# Altium schematic symbol library IC_ADI.SCHLIB: 3169 symbols (part 129 of 181)
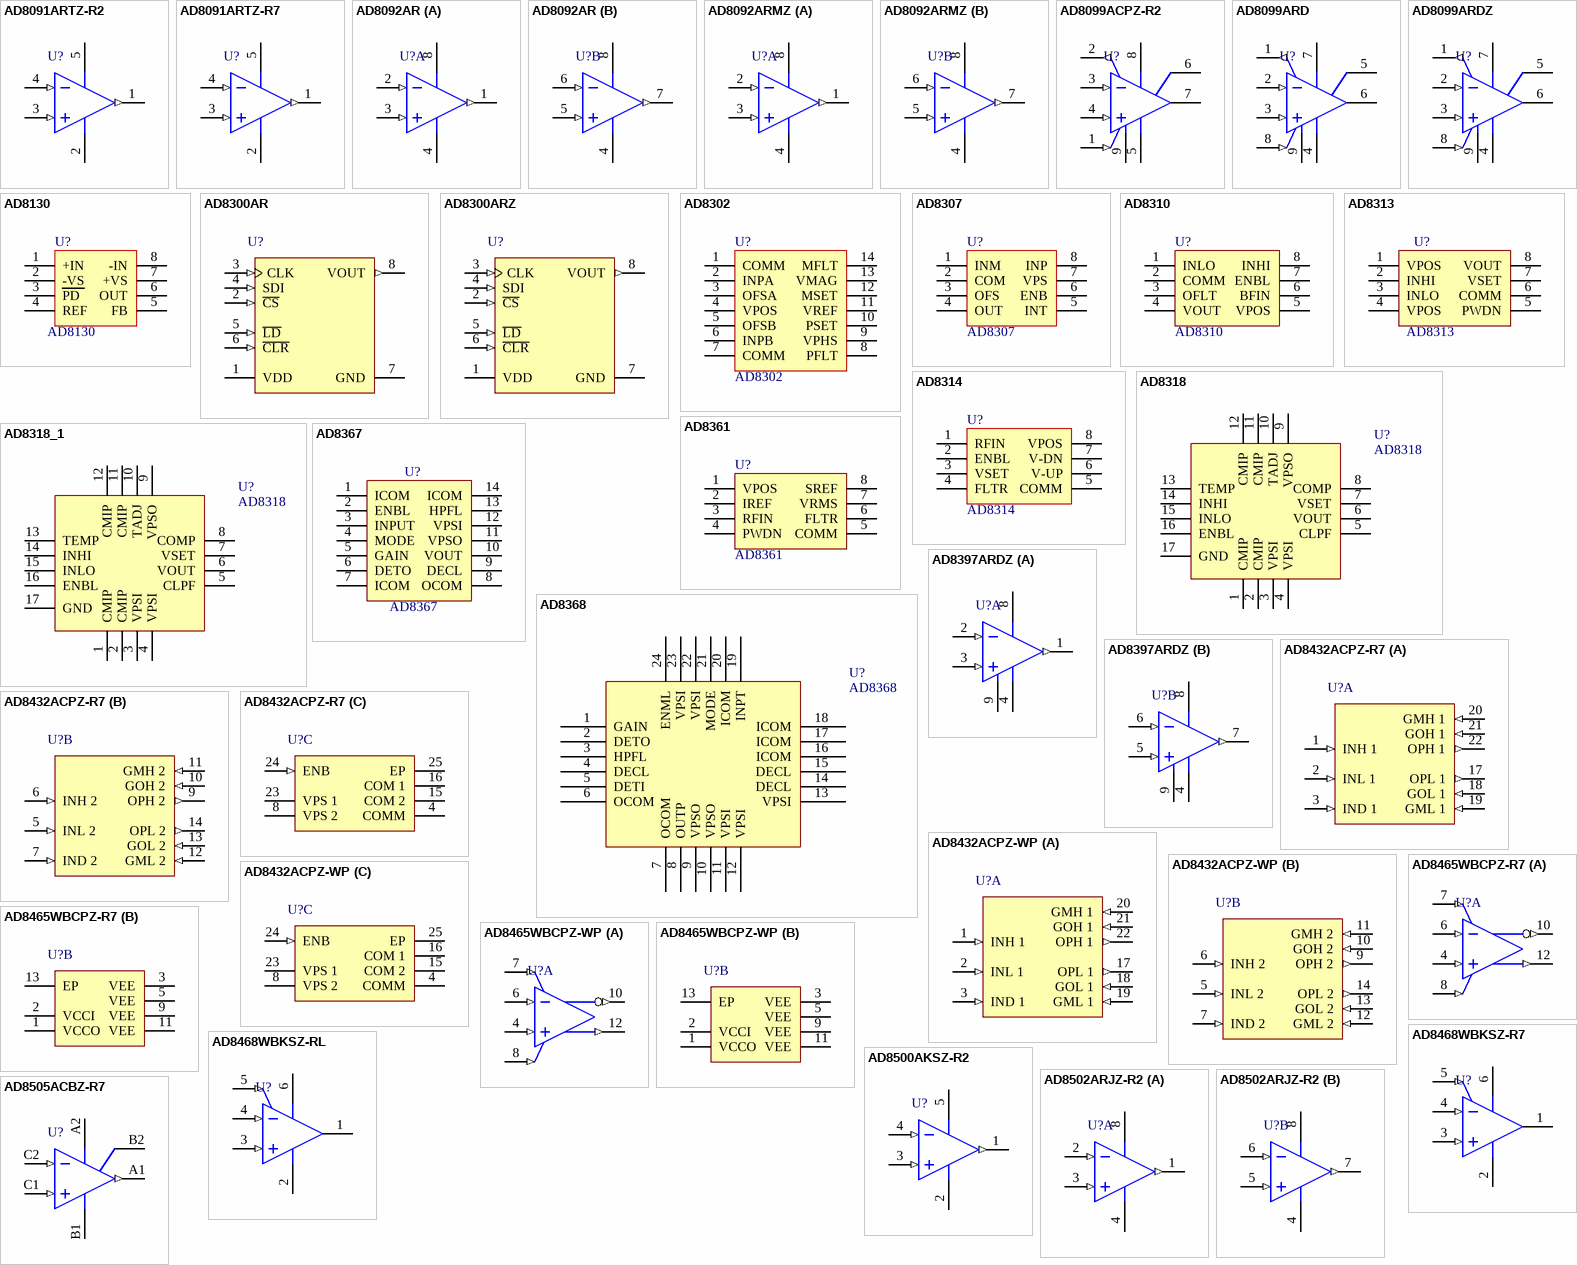
[diagram p319: symbols AD8091ARTZ-R2 to AD8505ACBZ-R7]

## AD8099ACPZ-R2
designator U?
Single Channel Ultra Low Noise Operational Amplifier, 500 MHz BW, 1.35 KV/us SR, Industrial, 8-pin QFN (CP-8-2), Reel; Generic Part Number: AD8099; PartNumber: AD8099ACPZ-R2; Amplifiers Per Package: 1; Input Bias Current: 3uA; Input Offset Voltage: 100uV; Iq/Amp: 16mA; Small Signal Bandwidth: 500MHz; V Span Max: 12V; V Span Min: 5V; DatasheetVersion: Rev. B; PackageVersion: 061507-B; PackageReference: CP-8-2; PackageDescription: 8-Pin Lead Frame Chip Scale Package, Body 3 x 3 mm, Pitch 0.5 mm; Supplier Part Number 1: 59K6359; Slew Rate: 1.35KV/us; Mounting Technology: Surface Mount; ComponentLink1Description: Manufacturer URL; ComponentLink2Description: Datasheet; ComponentLink3Description: Package Specification
footprint DFN8_0.5-PAD(3X3) (Footprint not found)
pins: 1 ~{DISABLE} (in), 2 FEEDBACK (out), 3 -IN (in), 4 +IN (in), 5 -VS (power), 6 CC, 7 VOUT (hiz), 8 +VS (power), 9 EP

## AD8099ARD
designator U?
Single Channel Ultra Low Noise Operational Amplifier, 500 MHz BW, 1.35 KV/us SR, Industrial, 8-pin SOIC (RD-8-1), Tube; Generic Part Number: AD8099; PartNumber: AD8099ARD; Amplifiers Per Package: 1; Input Bias Current: 3uA; Input Offset Voltage: 100uV; Iq/Amp: 16mA; Small Signal Bandwidth: 500MHz; V Span Max: 12V; V Span Min: 5V; DatasheetVersion: Rev. B; PackageVersion: 060506-A; PackageReference: RD-8-1; PackageDescription: 8-Pin Standard Small Outline Package, Body 4.9 x 3.9 mm, Pitch 1.27 mm; Supplier Part Number 1: AD8099ARD-ND; Slew Rate: 1.35KV/us; Mounting Technology: Surface Mount; Code_JEDEC: MS-012-AA; ComponentLink1Description: Manufacturer URL; ComponentLink2Description: Datasheet; ComponentLink3Description: Package Specification
footprint SOIC8_1.27-PAD (Footprint not found)
pins: 1 FEEDBACK (out), 2 -IN (in), 3 +IN (in), 4 -VS (power), 5 CC, 6 VOUT (hiz), 7 +VS (power), 8 ~{DISABLE} (in), 9 EP

## AD8099ARDZ
designator U?
Single Channel Ultra Low Noise Operational Amplifier, 500 MHz BW, 1.35 KV/us SR, Industrial, 8-pin SOIC (RD-8-1), Tube; Generic Part Number: AD8099; PartNumber: AD8099ARDZ; Amplifiers Per Package: 1; Input Bias Current: 3uA; Input Offset Voltage: 100uV; Iq/Amp: 16mA; Small Signal Bandwidth: 500MHz; V Span Max: 12V; V Span Min: 5V; DatasheetVersion: Rev. B; PackageVersion: 060506-A; PackageReference: RD-8-1; PackageDescription: 8-Pin Standard Small Outline Package, Body 4.9 x 3.9 mm, Pitch 1.27 mm; Supplier Part Number 1: AD8099ARDZ-ND; Supplier Part Number 2: 8397848; Supplier Part Number 3: 19M0932; Slew Rate: 1.35KV/us; Mounting Technology: Surface Mount; Code_JEDEC: MS-012-AA; ComponentLink1Description: Manufacturer URL; ComponentLink2Description: Datasheet; ComponentLink3Description: Package Specification
footprint SOIC8_1.27-PAD (Footprint not found)
pins: 1 FEEDBACK (out), 2 -IN (in), 3 +IN (in), 4 -VS (power), 5 CC, 6 VOUT (hiz), 7 +VS (power), 8 ~{DISABLE} (in), 9 EP

## AD8130
designator U?
footprint SOIC8_1.27 (SOP, 8-Leads, Pitch 1.27mm)
pins: 1 +IN, 2 -VS, 3 PD, 4 REF, 5 FB, 6 OUT, 7 +VS, 8 -IN

## AD8300AR
designator U?
Single 12-Bit Digital-to-Analog Converter with Serial Interface, 3 V, -40 to +85 degC, R-8, Tube; Generic Part Number: AD8300; PartNumber: AD8300AR; # DAC Outputs: 1; Max V+: 5.5V; Op Pwr Diss: 8.5mW; Resolution (Bits): 12; Settling Time: 14祍; Single Supply: Yes; DatasheetVersion: Rev.A; PackageVersion: 060506-A; PackageReference: R-8; PackageDescription: 8-Lead Standard Small Outline Package [SOIC_N] Narrow Body; Supplier Part Number 1: AD8300AR-ND; Supplier Part Number 2: 584-AD8300AR; Packing: Tube; RoHS: N; Mounting Technology: Surface Mount; Code_JEDEC: MS-012-AA; Code_IPC: SOIC127P600-8; ComponentLink1Description: Manufacturer URL; ComponentLink2Description: Datasheet; ComponentLink3Description: Package Specification; ComponentLink4Description: Product URL
footprint SOIC8_1.27 (Footprint not found)
pins: 1 VDD (power) "Positive power supply input. Specified range of operation +2.7 V to +5.5 V.", 2 ~{CS} (in) "Chip Select, active low input. Disables shift register loading when high. Does not affect L\D\ operation.", 3 CLK (in) "Clock input, positive edge clocks data into shift register.", 4 SDI (in) "Serial Data Input, input data loads directly into the shift register, MSB first.", 5 ~{LD} (in) "Load DAC register strobes, active low. Transfers shift register data to DAC register. See Truth Table I for operation. Asynchronous active low input.", 6 ~{CLR} (in) "Resets DAC register to zero condition. Asynchronous active low input.", 7 GND (power) "Analog and Digital Ground.", 8 VOUT (out) "DAC voltage output, 2.0475 V full scale with 0.5 mV per bit. An internal temperature stabilized reference maintains a fixed full-scale voltage independent of time, temperature and power supply variations."

## AD8300ARZ
designator U?
Single 12-Bit Digital-to-Analog Converter with Serial Interface, 3 V, -40 to +85 degC, R-8, Pb-Free, Tube; Generic Part Number: AD8300; PartNumber: AD8300ARZ; # DAC Outputs: 1; Max V+: 5.5V; Op Pwr Diss: 8.5mW; Resolution (Bits): 12; Settling Time: 14祍; Single Supply: Yes; DatasheetVersion: Rev.A; PackageVersion: 060506-A; PackageReference: R-8; PackageDescription: 8-Lead Standard Small Outline Package [SOIC_N] Narrow Body; Supplier Part Number 1: AD8300ARZ-ND; Supplier Part Number 2: 1438629; Supplier Part Number 3: 59K6546; Supplier Part Number 4: 584-AD8300ARZ; Packing: Tube; RoHS: Y; Mounting Technology: Surface Mount; Code_JEDEC: MS-012-AA; Code_IPC: SOIC127P600-8; ComponentLink1Description: Manufacturer URL; ComponentLink2Description: Datasheet; ComponentLink3Description: Package Specification; ComponentLink4Description: Product URL
footprint SOIC8_1.27 (Footprint not found)
pins: 1 VDD (power) "Positive power supply input. Specified range of operation +2.7 V to +5.5 V.", 2 ~{CS} (in) "Chip Select, active low input. Disables shift register loading when high. Does not affect L\D\ operation.", 3 CLK (in) "Clock input, positive edge clocks data into shift register.", 4 SDI (in) "Serial Data Input, input data loads directly into the shift register, MSB first.", 5 ~{LD} (in) "Load DAC register strobes, active low. Transfers shift register data to DAC register. See Truth Table I for operation. Asynchronous active low input.", 6 ~{CLR} (in) "Resets DAC register to zero condition. Asynchronous active low input.", 7 GND (power) "Analog and Digital Ground.", 8 VOUT (out) "DAC voltage output, 2.0475 V full scale with 0.5 mV per bit. An internal temperature stabilized reference maintains a fixed full-scale voltage independent of time, temperature and power supply variations."

## AD8302
designator U?
footprint TSSOP14_0.65 (TSOP, 14-Leads, Body 5.00x4.40mm, Pitch 0.65mm, Thermal Pad 2.31x2.46mm, IPC Low Density)
pins: 1 COMM, 2 INPA, 3 OFSA, 4 VPOS, 5 OFSB, 6 INPB, 7 COMM, 8 PFLT, 9 VPHS, 10 PSET, 11 VREF, 12 MSET, 13 VMAG, 14 MFLT

## AD8307
designator U?
footprint SOIC8_1.27 (SOP, 8-Leads, Pitch 1.27mm)
pins: 1 INM, 2 COM, 3 OFS, 4 OUT, 5 INT, 6 ENB, 7 VPS, 8 INP

## AD8310
designator U?
footprint VSSOP8_0.65
pins: 1 INLO, 2 COMM, 3 OFLT, 4 VOUT, 5 VPOS, 6 BFIN, 7 ENBL, 8 INHI

## AD8313
designator U?
footprint VSSOP8_0.65
pins: 1 VPOS, 2 INHI, 3 INLO, 4 VPOS, 5 PWDN, 6 COMM, 7 VSET, 8 VOUT

## AD8314
designator U?
footprint VSSOP8_0.65
pins: 1 RFIN, 2 ENBL, 3 VSET, 4 FLTR, 5 COMM, 6 V-UP, 7 V-DN, 8 VPOS

## AD8318
designator U?
footprint QFN16_0.65-PAD(4x4) (QFN, 16-Leads, Body 3.0x3.0mm (max), Pitch 0.50mm, IPC Low Density)
pins: 1 CMIP, 2 CMIP, 3 VPSI, 4 VPSI, 5 CLPF, 6 VOUT, 7 VSET, 8 COMP, 9 VPSO, 10 TADJ, 11 CMIP, 12 CMIP, 13 TEMP, 14 INHI, 15 INLO, 16 ENBL, 17 GND

## AD8318_1
designator U?, comment AD8318
pins: 1 CMIP, 2 CMIP, 3 VPSI, 4 VPSI, 5 CLPF, 6 VOUT, 7 VSET, 8 COMP, 9 VPSO, 10 TADJ, 11 CMIP, 12 CMIP, 13 TEMP, 14 INHI, 15 INLO, 16 ENBL, 17 GND

## AD8361
designator U?
footprint VSSOP8_0.65
pins: 1 VPOS, 2 IREF, 3 RFIN, 4 PWDN, 5 COMM, 6 FLTR, 7 VRMS, 8 SREF

## AD8367
designator U?
footprint TSSOP14_0.65 (TSOP, 14-Leads, Body 5.00x4.40mm, Pitch 0.65mm, Thermal Pad 2.31x2.46mm, IPC Low Density)
pins: 1 ICOM, 2 ENBL, 3 INPUT, 4 MODE, 5 GAIN, 6 DETO, 7 ICOM, 8 OCOM, 9 DECL, 10 VOUT, 11 VPSO, 12 VPSI, 13 HPFL, 14 ICOM

## AD8368
designator U?
footprint QFN24_0.5(4X4)
pins: 1 GAIN, 2 DETO, 3 HPFL, 4 DECL, 5 DETI, 6 OCOM, 7 OCOM, 8 OUTP, 9 VPSO, 10 VPSO, 11 VPSI, 12 VPSI, 13 VPSI, 14 DECL, 15 DECL, 16 ICOM, 17 ICOM, 18 ICOM, 19 INPT, 20 ICOM, 21 MODE, 22 VPSI, 23 VPSI, 24 ENML

## AD8397ARDZ
designator U?
Double Channel Low Noise Operational Amplifier, 69 MHz BW, 53 V/us SR, Industrial, 8-pin SOIC (RD-8-2), Tube; Generic Part Number: AD8397; PartNumber: AD8397ARDZ; Amplifiers Per Package: 2; Input Bias Current: 200nA; Input Offset Voltage: 1mV; Iq/Amp: 15mA; Slew Rate: 53V/us; Small Signal Bandwidth: 69MHz; V Span Max: 24V; V Span Min: 3V; DatasheetVersion: Rev. A; PackageReference: RD-8-2; PackageDescription: 8-Pin Standard Small Outline Package, Body 4.9 x 3.9 mm, Pitch 1.27 mm; Supplier Part Number 1: AD8397ARDZ-ND; Supplier Part Number 2: 1078283; Supplier Part Number 3: 59K6702; Mounting Technology: Surface Mount; Code_JEDEC: MS-012-AA; ComponentLink1Description: Manufacturer URL; ComponentLink2Description: Datasheet; ComponentLink3Description: Package Specification
footprint SOIC8_1.27-PAD (Footprint not found)
pins on every part: 4 -VS (power), 8 +VS (power), 9 EP
part A pins: 1 OUT 1 (out), 2 -IN 1 (in), 3 +IN 1 (in)
part B pins: 5 +IN 2 (in), 6 -IN 2 (in), 7 OUT 2 (out)

## AD8432ACPZ-R7
designator U?
Double Channel Low Power Operational Amplifier, 200 MHz BW, 170 V/us SR, Industrial, 24-pin QFN (CP-24-7), Reel; Generic Part Number: AD8432; PartNumber: AD8432ACPZ-R7; Amplifiers Per Package: 2; Input Offset Voltage: 1mV; Iq/Amp: 12mA; Small Signal Bandwidth: 200MHz; V Span Max: 5.5V; V Span Min: 4.5V; DatasheetVersion: Rev. C; PackageVersion: 112108-A; PackageReference: CP-24-7; PackageDescription: 24-Pin Lead Frame Chip Scale Package, Body 4 x 4 mm, Pitch 0.5 mm; Supplier Part Number 1: AD8432ACPZ-R7-ND; Supplier Part Number 2: 52R8167; Packing: Reel; Slew Rate: 170V/us; Mounting Technology: Surface Mount; Code_JEDEC: MO-220-WGGD; ComponentLink1Description: Manufacturer URL; ComponentLink2Description: Datasheet; ComponentLink3Description: Package Specification
footprint QFN24_0.5-PAD(4X4) (Footprint not found)
part A pins: 1 INH 1 (in) "LNA1 Noninverting Input.", 2 INL 1 (in) "LNA1 Inverting Input (AC-Coupled to Ground).", 3 IND 1 (in) "Integrated Input Clamping Back-to-Back Diodes.", 17 OPL 1 (out) "Inverting Output of LNA1.", 18 GOL 1 (in) "Gain Setting Pin for LNA1.", 19 GML 1 (in) "Gain Setting Pin for LNA1.", 20 GMH 1 (in) "Gain Setting Pin for LNA1.", 21 GOH 1 (in) "Gain Setting Pin for LNA1.", 22 OPH 1 (out) "Noninverting Output of LNA1."
part B pins: 5 INL 2 (in) "LNA2 Inverting Input (AC-Coupled to Ground).", 6 INH 2 (in) "LNA2 Noninverting Input.", 7 IND 2 (in) "Integrated Input Clamping Back-to-Back Diodes.", 9 OPH 2 (out) "Noninverting Output of LNA2.", 10 GOH 2 (in) "Gain Setting Pin for LNA2.", 11 GMH 2 (in) "Gain Setting Pin for LNA2.", 12 GML 2 (in) "Gain Setting Pin for LNA2.", 13 GOL 2 (in) "Gain Setting Pin for LNA2.", 14 OPL 2 (out) "Inverting Output of LNA2."
part C pins: 4 COMM (power) "Input Ground.", 8 VPS 2 (power) "5 V Supply.", 15 COM 2 (power) "LNA2 Output Ground.", 16 COM 1 (power) "LNA1 Output Ground.", 23 VPS 1 (power) "5 V Supply.", 24 ENB (in) "Enable.", 25 EP (power) "Exposed pad must be connected to ground."

## AD8432ACPZ-WP
designator U?
Double Channel Low Power Operational Amplifier, 200 MHz BW, 170 V/us SR, Industrial, 24-pin QFN (CP-24-7), Tray; Generic Part Number: AD8432; PartNumber: AD8432ACPZ-WP; Amplifiers Per Package: 2; Input Offset Voltage: 1mV; Iq/Amp: 12mA; Small Signal Bandwidth: 200MHz; V Span Max: 5.5V; V Span Min: 4.5V; DatasheetVersion: Rev. C; PackageVersion: 112108-A; PackageReference: CP-24-7; PackageDescription: 24-Pin Lead Frame Chip Scale Package, Body 4 x 4 mm, Pitch 0.5 mm; Supplier Part Number 1: AD8432ACPZ-WP-ND; Supplier Part Number 2: 1827462; Supplier Part Number 3: 52R8168; Packing: Tray; Slew Rate: 170V/us; Mounting Technology: Surface Mount; Code_JEDEC: MO-220-WGGD; ComponentLink1Description: Manufacturer URL; ComponentLink2Description: Datasheet; ComponentLink3Description: Package Specification
footprint QFN24_0.5-PAD(4X4) (Footprint not found)
part A pins: 1 INH 1 (in) "LNA1 Noninverting Input.", 2 INL 1 (in) "LNA1 Inverting Input (AC-Coupled to Ground).", 3 IND 1 (in) "Integrated Input Clamping Back-to-Back Diodes.", 17 OPL 1 (out) "Inverting Output of LNA1.", 18 GOL 1 (in) "Gain Setting Pin for LNA1.", 19 GML 1 (in) "Gain Setting Pin for LNA1.", 20 GMH 1 (in) "Gain Setting Pin for LNA1.", 21 GOH 1 (in) "Gain Setting Pin for LNA1.", 22 OPH 1 (out) "Noninverting Output of LNA1."
part B pins: 5 INL 2 (in) "LNA2 Inverting Input (AC-Coupled to Ground).", 6 INH 2 (in) "LNA2 Noninverting Input.", 7 IND 2 (in) "Integrated Input Clamping Back-to-Back Diodes.", 9 OPH 2 (out) "Noninverting Output of LNA2.", 10 GOH 2 (in) "Gain Setting Pin for LNA2.", 11 GMH 2 (in) "Gain Setting Pin for LNA2.", 12 GML 2 (in) "Gain Setting Pin for LNA2.", 13 GOL 2 (in) "Gain Setting Pin for LNA2.", 14 OPL 2 (out) "Inverting Output of LNA2."
part C pins: 4 COMM (power) "Input Ground.", 8 VPS 2 (power) "5 V Supply.", 15 COM 2 (power) "LNA2 Output Ground.", 16 COM 1 (power) "LNA1 Output Ground.", 23 VPS 1 (power) "5 V Supply.", 24 ENB (in) "Enable.", 25 EP (power) "Exposed pad must be connected to ground."

## AD8465WBCPZ-R7
designator U?
Rail-to-Rail, Very Fast, Single-Supply LVDS Comparator, 2.5 to 5.5 V, 1.6 ns Delay, Automotive, 12-pin QFN (CP-12-3), Reel; PartNumber: AD8465WBCPZ-R7; Input Range (V): -0.2 to VCCI+0.2; Total Power (mW): 42mW; DatasheetVersion: Rev. A; PackageVersion: 032707-A, 03/2007; PackageReference: CP-12-3; PackageDescription: 12-Pin Lead Frame Chip Scale Package, Body 3 x 3 mm, Pitch 0.5 mm; Supplier Part Number 1: AD8465WBCPZ-R7TR-ND; Supplier Part Number 2: AD8465WBCPZ-R7CT-ND; Supplier Part Number 3: AD8465WBCPZ-R7DKR-ND; Supplier Part Number 4: 584-AD8465WBCPZ-R7; Packing: Reel; Voltage Supply (V): 2.5 to 5.5; Mounting Technology: Surface Mount; Code_JEDEC: MO-220-VEED-1; ComponentLink1Description: Manufacturer URL; ComponentLink2Description: Datasheet; ComponentLink3Description: Package Specification; ComponentLink4Description: URL Link1
footprint QFN12_0.5-PAD(3X3) (Footprint not found)
part A pins: 4 VP (in) "Noninverting Analog Input.", 6 VN (in) "Inverting Analog Input.", 7 SDN (in) "Shutdown. Drive this pin low to shut down the device.", 8 LE/HYS (in) "Latch/Hysteresis Control. Bias with resistor or current for hysteresis; drive low to latch.", 10 ~{Q} (out) "Inverting Output. Q\ is at Logic low if the analog voltage at the noninverting input, VP, is greater than the analog voltage at the inverting input, VN, if the comparator is in compare mode.", 12 Q (out) "Noninverting Output. Q is at Logic high if the analog voltage at the noninverting input, VP, is greater than the analog voltage at the inverting input, VN, if the comparator is in compare mode."
part B pins: 1 VCCO (power) "Output Section Supply.", 2 VCCI (power) "Input Section Supply.", 3 VEE (power) "Negative Supply Voltages.", 5 VEE (power) "Negative Supply Voltages.", 9 VEE (power) "Negative Supply Voltages.", 11 VEE (power) "Negative Supply Voltages.", 13 EP "The metallic back surface of the package is electrically connected to VEE. It can be left floating because Pin 3, Pin 5, Pin 9, and Pin 11 provide adequate electrical connection. It can also be soldered to the application (See Datasheet)"

## AD8465WBCPZ-WP
designator U?
Rail-to-Rail, Very Fast, Single-Supply LVDS Comparator, 2.5 to 5.5 V, 1.6 ns Delay, Automotive, 12-pin QFN (CP-12-3), Tray; PartNumber: AD8465WBCPZ-WP; Input Range (V): -0.2 to VCCI+0.2; Total Power (mW): 42mW; DatasheetVersion: Rev. A; PackageVersion: 032707-A, 03/2007; PackageReference: CP-12-3; PackageDescription: 12-Pin Lead Frame Chip Scale Package, Body 3 x 3 mm, Pitch 0.5 mm; Supplier Part Number 1: AD8465WBCPZ-WP-ND; Supplier Part Number 2: 1827369; Supplier Part Number 3: 584-AD8465WBCPZ-WP; Packing: Tray; Voltage Supply (V): 2.5 to 5.5; Mounting Technology: Surface Mount; Code_JEDEC: MO-220-VEED-1; ComponentLink1Description: Manufacturer URL; ComponentLink2Description: Datasheet; ComponentLink3Description: Package Specification; ComponentLink4Description: URL Link1
footprint QFN12_0.5-PAD(3X3) (Footprint not found)
part A pins: 4 VP (in) "Noninverting Analog Input.", 6 VN (in) "Inverting Analog Input.", 7 SDN (in) "Shutdown. Drive this pin low to shut down the device.", 8 LE/HYS (in) "Latch/Hysteresis Control. Bias with resistor or current for hysteresis; drive low to latch.", 10 ~{Q} (out) "Inverting Output. Q\ is at Logic low if the analog voltage at the noninverting input, VP, is greater than the analog voltage at the inverting input, VN, if the comparator is in compare mode.", 12 Q (out) "Noninverting Output. Q is at Logic high if the analog voltage at the noninverting input, VP, is greater than the analog voltage at the inverting input, VN, if the comparator is in compare mode."
part B pins: 1 VCCO (power) "Output Section Supply.", 2 VCCI (power) "Input Section Supply.", 3 VEE (power) "Negative Supply Voltages.", 5 VEE (power) "Negative Supply Voltages.", 9 VEE (power) "Negative Supply Voltages.", 11 VEE (power) "Negative Supply Voltages.", 13 EP "The metallic back surface of the package is electrically connected to VEE. It can be left floating because Pin 3, Pin 5, Pin 9, and Pin 11 provide adequate electrical connection. It can also be soldered to the application (See Datasheet)"

## AD8468WBKSZ-R7
designator U?
Rail-to-Rail, Fast, Low Power, Single-Supply TTL / CMOS Comparator, 2.5 to 5.5 V, 40 ns Delay, Automotive, 6-pin SOT23 (KS-6), Reel; PartNumber: AD8468WBKSZ-R7; Input Range (V): -0.2 to VCC+0.2; Total Power (mW): 2mW; DatasheetVersion: Rev. 0; PackageVersion: 072809-A, 07/2009; PackageReference: KS-6; PackageDescription: 6-Pin Thin Shrink Small Outline Transistor Package, Body 2 x 1.25 mm, Pitch 0.65 mm; Supplier Part Number 1: AD8468WBKSZ-R7TR-ND; Supplier Part Number 2: AD8468WBKSZ-R7CT-ND; Supplier Part Number 3: AD8468WBKSZ-R7DKR-ND; Supplier Part Number 4: 2376806; Supplier Part Number 5: 1872638; Supplier Part Number 6: 584-AD8468WBKSZ-R7; Packing: Reel; Voltage Supply (V): 2.5 to 5.5; Mounting Technology: Surface Mount; Code_JEDEC: MO-203-AB; ComponentLink1Description: Manufacturer URL; ComponentLink2Description: Datasheet; ComponentLink3Description: Package Specification; ComponentLink4Description: URL Link1
footprint SOT363 (Footprint not found)
pins: 1 Q (hiz) "Noninverting Output. Q is at logic high if the analog voltage at the noninverting input, VP, is greater than the analog voltage at the inverting input, VN.", 2 GND (power) "Ground.", 3 VP (in) "Noninverting Analog Input.", 4 VN (in) "Inverting Analog Input.", 5 SDN (in) "Shutdown. Drive this pin low to shut down the device.", 6 VCC (power) "VCC Supply."

## AD8468WBKSZ-RL
designator U?
Rail-to-Rail, Fast, Low Power, Single-Supply TTL / CMOS Comparator, 2.5 to 5.5 V, 40 ns Delay, Automotive, 6-pin SOT23 (KS-6), Reel; PartNumber: AD8468WBKSZ-RL; Input Range (V): -0.2 to VCC+0.2; Total Power (mW): 2mW; DatasheetVersion: Rev. 0; PackageVersion: 072809-A, 07/2009; PackageReference: KS-6; PackageDescription: 6-Pin Thin Shrink Small Outline Transistor Package, Body 2 x 1.25 mm, Pitch 0.65 mm; Supplier Part Number 1: 584-AD8468WBKSZ-R; Packing: Reel; Voltage Supply (V): 2.5 to 5.5; Mounting Technology: Surface Mount; Code_JEDEC: MO-203-AB; ComponentLink1Description: Manufacturer URL; ComponentLink2Description: Datasheet; ComponentLink3Description: Package Specification; ComponentLink4Description: URL Link1
footprint SOT363 (Footprint not found)
pins: 1 Q (hiz) "Noninverting Output. Q is at logic high if the analog voltage at the noninverting input, VP, is greater than the analog voltage at the inverting input, VN.", 2 GND (power) "Ground.", 3 VP (in) "Noninverting Analog Input.", 4 VN (in) "Inverting Analog Input.", 5 SDN (in) "Shutdown. Drive this pin low to shut down the device.", 6 VCC (power) "VCC Supply."

## AD8500AKSZ-R2
designator U?
Single Channel RRIO Operational Amplifier, 7 KHz BW, 4 mV/us SR, Industrial, 5-pin SOT23 (KS-5), Reel; Generic Part Number: AD8500; PartNumber: AD8500AKSZ-R2; Amplifiers Per Package: 1; Input Bias Current: 1pA; Input Offset Voltage: 235uV; Iq/Amp: 750nA; Slew Rate: 4mV/us; Small Signal Bandwidth: 7KHz; V Span Max: 5.5V; V Span Min: 1.8V; DatasheetVersion: Rev. B; PackageVersion: 072809-A; PackageReference: KS-5; PackageDescription: 5-Pin Thin Shrink Small Outline Transistor Package, Body 2 x 1.25 mm, Pitch 0.65 mm; Supplier Part Number 1: AD8500AKSZ-R2-ND; Supplier Part Number 2: 1838864; Supplier Part Number 3: 12M9104; Mounting Technology: Surface Mount; Code_JEDEC: MO-203-AA; ComponentLink1Description: Manufacturer URL; ComponentLink2Description: Datasheet; ComponentLink3Description: Package Specification
footprint SOT353 (Footprint not found)
pins: 1 OUT A (out), 2 -V (power), 3 +IN (in), 4 -IN (in), 5 +V (power)

## AD8502ARJZ-R2
designator U?
Double Channel RRIO Operational Amplifier, 7 KHz BW, 4 mV/us SR, Industrial, 8-pin SOT23 (RJ-8), Reel; Generic Part Number: AD8502; PartNumber: AD8502ARJZ-R2; Amplifiers Per Package: 2; Input Bias Current: 1pA; Input Offset Voltage: 500uV; Iq/Amp: 1uA; Slew Rate: 4mV/us; Small Signal Bandwidth: 7KHz; V Span Max: 5.5V; V Span Min: 1.8V; DatasheetVersion: Rev. A; PackageVersion: 121608-A; PackageReference: RJ-8; PackageDescription: 8-Pin Small Outline Transistor Package, Body 2.9 x 1.6 mm, Pitch 0.65 mm; Supplier Part Number 1: AD8502ARJZ-R2TR-ND; Supplier Part Number 2: AD8502ARJZ-R2CT-ND; Supplier Part Number 3: AD8502ARJZ-R2DKR-ND; Supplier Part Number 4: 1699561; Supplier Part Number 5: 34M5069; Mounting Technology: Surface Mount; Code_JEDEC: MO-178-BA; ComponentLink1Description: Manufacturer URL; ComponentLink2Description: Datasheet; ComponentLink3Description: Package Specification
footprint SOT23-8 (Footprint not found)
pins on every part: 4 -V (power), 8 +V (power)
part A pins: 1 OUT A (out), 2 -IN A (in), 3 +IN A (in)
part B pins: 5 +IN B (in), 6 -IN B (in), 7 OUT B (out)

## AD8505ACBZ-R7
designator U?
Single Channel Rail-to-Rail Operational Amplifier, 95 Hz BW, 13 mV/us SR, Industrial, 6-pin BGA (CB-6-7), Reel; Generic Part Number: AD8505; PartNumber: AD8505ACBZ-R7; Amplifiers Per Package: 1; Input Bias Current: 1pA; Input Offset Voltage: 500uV; Iq/Amp: 25.5uA; Small Signal Bandwidth: 95Hz; V Span Max: 5V; V Span Min: 1.8V; DatasheetVersion: Rev. E; PackageVersion: 081709-A; PackageReference: CB-6-7; PackageDescription: 6-Ball Wafer Level Chip Scale Package, Body 1.385 x 0.905 mm, Pitch 0.4 mm; Supplier Part Number 1: AD8505ACBZ-R7TR-ND; Supplier Part Number 2: AD8505ACBZ-R7CT-ND; Supplier Part Number 3: AD8505ACBZ-R7DKR-ND; Slew Rate: 13mV/us; Mounting Technology: Surface Mount; ComponentLink1Description: Manufacturer URL; ComponentLink2Description: Datasheet; ComponentLink3Description: Package Specification
footprint BGA6_0.4(1.4x1) (Footprint not found)
pins: A1 OUT (out), A2 +V (power), B1 -V (power), B2 NC, C1 +IN (in), C2 -IN (in)

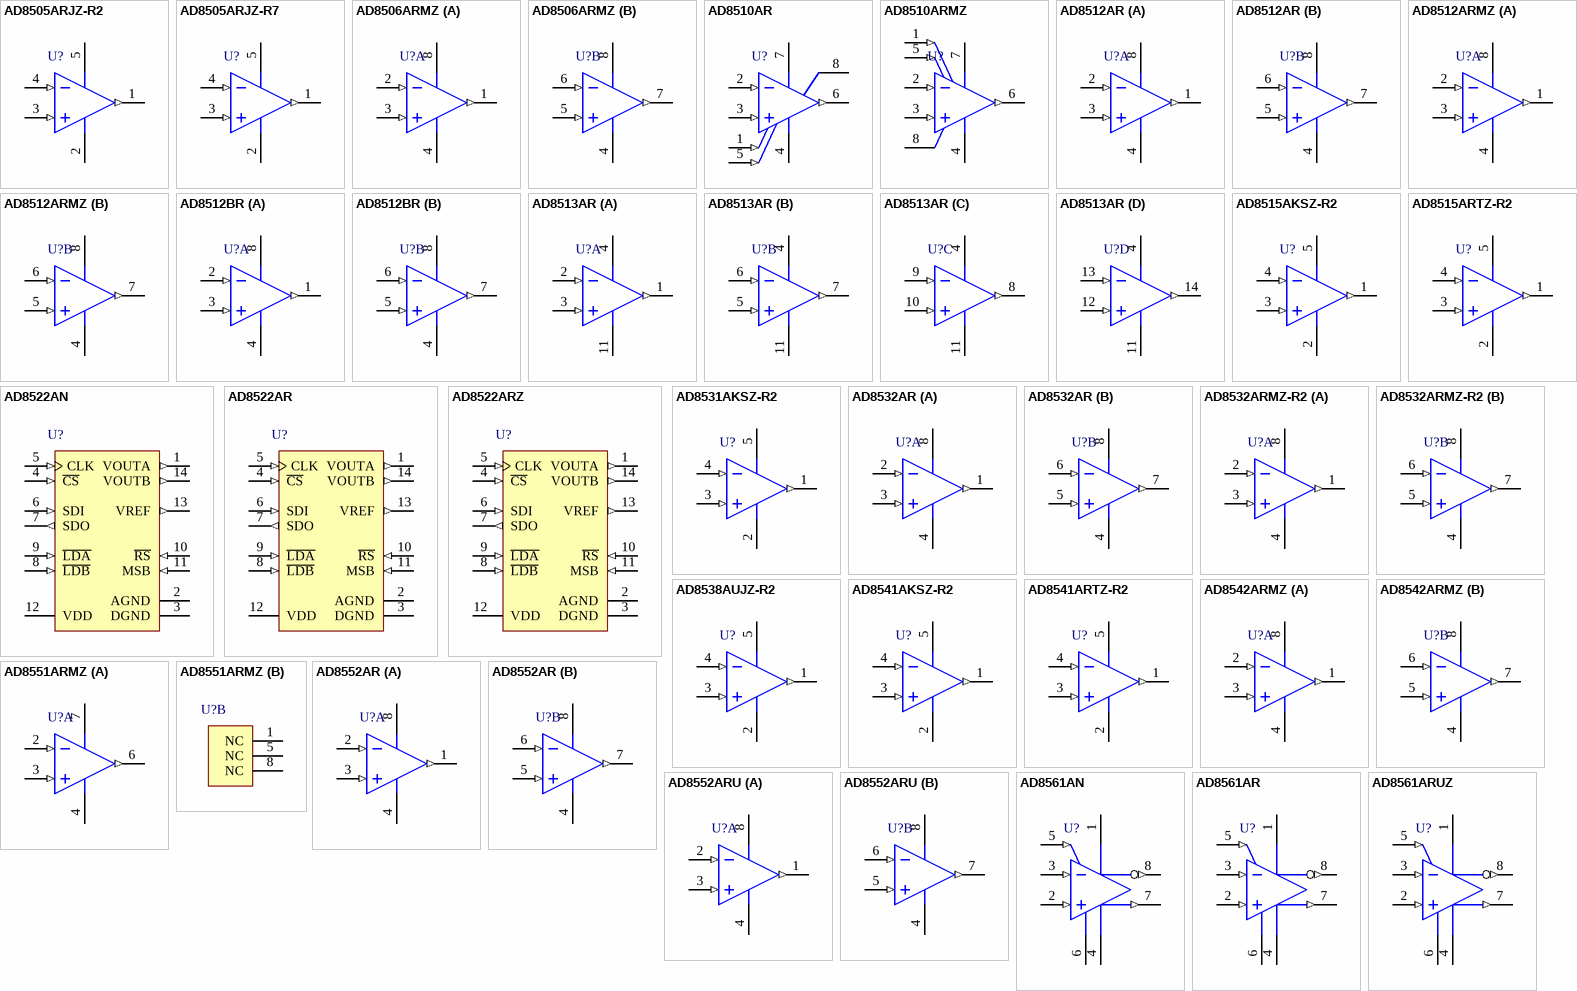
[diagram p95: symbols AD8505ARJZ-R2 to AD8561ARUZ]

## AD8505ARJZ-R2
designator U?
Single Channel Rail-to-Rail Operational Amplifier, 95 Hz BW, 13 mV/us SR, Industrial, 5-pin SOT23 (RJ-5), Reel; Generic Part Number: AD8505; PartNumber: AD8505ARJZ-R2; Amplifiers Per Package: 1; Input Bias Current: 1pA; Input Offset Voltage: 500uV; Iq/Amp: 25.5uA; Small Signal Bandwidth: 95Hz; V Span Max: 5V; V Span Min: 1.8V; DatasheetVersion: Rev. E; PackageVersion: 121608-A; PackageReference: RJ-5; PackageDescription: 5-Pin Small Outline Transistor Package, Body 2.9 x 1.6 mm, Pitch 0.95 mm; Supplier Part Number 1: AD8505ARJZ-R2TR-ND; Supplier Part Number 2: AD8505ARJZ-R2CT-ND; Supplier Part Number 3: AD8505ARJZ-R2DKR-ND; Slew Rate: 13mV/us; Mounting Technology: Surface Mount; Code_JEDEC: MO-178-AA; ComponentLink1Description: Manufacturer URL; ComponentLink2Description: Datasheet; ComponentLink3Description: Package Specification
footprint SOT23-5 (Footprint not found)
pins: 1 OUT (out), 2 -V (power), 3 +IN (in), 4 -IN (in), 5 +V (power)

## AD8505ARJZ-R7
designator U?
Single Channel Rail-to-Rail Operational Amplifier, 95 Hz BW, 13 mV/us SR, Industrial, 5-pin SOT23 (RJ-5), Reel; Generic Part Number: AD8505; PartNumber: AD8505ARJZ-R7; Amplifiers Per Package: 1; Input Bias Current: 1pA; Input Offset Voltage: 500uV; Iq/Amp: 25.5uA; Small Signal Bandwidth: 95Hz; V Span Max: 5V; V Span Min: 1.8V; DatasheetVersion: Rev. E; PackageVersion: 121608-A; PackageReference: RJ-5; PackageDescription: 5-Pin Small Outline Transistor Package, Body 2.9 x 1.6 mm, Pitch 0.95 mm; Supplier Part Number 1: AD8505ARJZ-R7-ND; Supplier Part Number 2: 1827370; Supplier Part Number 3: 1827370RL; Supplier Part Number 4: 85R5213; Supplier Part Number 5: 52R8171; Slew Rate: 13mV/us; Mounting Technology: Surface Mount; Code_JEDEC: MO-178-AA; ComponentLink1Description: Manufacturer URL; ComponentLink2Description: Datasheet; ComponentLink3Description: Package Specification
footprint SOT23-5 (Footprint not found)
pins: 1 OUT (out), 2 -V (power), 3 +IN (in), 4 -IN (in), 5 +V (power)

## AD8506ARMZ
designator U?
Double Channel Rail-to-Rail Operational Amplifier, 150 KHz BW, 13 mV/us SR, Industrial, 8-pin SOP (RM-8), Tube; Generic Part Number: AD8506; PartNumber: AD8506ARMZ; Amplifiers Per Package: 2; Input Bias Current: 1pA; Input Offset Voltage: 2.5mV; Iq/Amp: 20uA; Small Signal Bandwidth: 150KHz; V Span Max: 5.5V; V Span Min: 1.8V; DatasheetVersion: Rev. E; PackageReference: RM-8; PackageDescription: 8-Pin Mini Small Outline Package, Body 3 x 3 mm, Pitch 0.65 mm; Supplier Part Number 1: AD8506ARMZ-ND; Slew Rate: 13mV/us; Mounting Technology: Surface Mount; Code_JEDEC: MO-187-AA; ComponentLink1Description: Manufacturer URL; ComponentLink2Description: Datasheet; ComponentLink3Description: Package Specification
footprint VSSOP8_0.65 (Footprint not found)
pins on every part: 4 -V (power), 8 +V (power)
part A pins: 1 OUT A (out), 2 -IN A (in), 3 +IN A (in)
part B pins: 5 +IN B (in), 6 -IN B (in), 7 OUT B (out)

## AD8510AR
designator U?
Single Channel Low Offset Voltage Operational Amplifier, 8 MHz BW, 20 V/us SR, Industrial, 8-pin SOIC (R-8), Tube; Generic Part Number: AD8510; PartNumber: AD8510AR; Amplifiers Per Package: 1; Input Bias Current: 21pA; Input Offset Voltage: 80uV; Iq/Amp: 2.5mA; Slew Rate: 20V/us; Small Signal Bandwidth: 8MHz; V Span Max: 36V; V Span Min: 9V; DatasheetVersion: Rev. I; PackageVersion: 060506-A; PackageReference: R-8; PackageDescription: 8-Pin Standard Small Outline Package, Body 3.9 x 4.9 mm, Pitch 1.27 mm; Supplier Part Number 1: AD8510AR-ND; Mounting Technology: Surface Mount; Code_JEDEC: MS-012-AA; ComponentLink1Description: Manufacturer URL; ComponentLink2Description: Datasheet; ComponentLink3Description: Package Specification; ComponentLink4Description: Reference Circuit
footprint SOIC8_1.27 (Footprint not found)
pins: 1 NULL (in), 2 -IN (in), 3 +IN (in), 4 -V (power), 5 NULL (in), 6 OUT (out), 7 +V (power), 8 NC

## AD8510ARMZ
designator U?
Single Channel Low Offset Voltage Operational Amplifier, 8 MHz BW, 20 V/us SR, Industrial, 8-pin SOP (RM-8), Tube; Generic Part Number: AD8510; PartNumber: AD8510ARMZ; Amplifiers Per Package: 1; Input Bias Current: 21pA; Input Offset Voltage: 80uV; Iq/Amp: 2.5mA; Slew Rate: 20V/us; Small Signal Bandwidth: 8MHz; V Span Max: 36V; V Span Min: 9V; DatasheetVersion: Rev. I; PackageReference: RM-8; PackageDescription: 8-Pin Mini Small Outline Package, Body 3 x 3 mm, Pitch 0.65 mm; Supplier Part Number 1: AD8510ARMZ-ND; Supplier Part Number 2: 45P6465; Mounting Technology: Surface Mount; Code_JEDEC: MO-187-AA; ComponentLink1Description: Manufacturer URL; ComponentLink2Description: Datasheet; ComponentLink3Description: Package Specification; ComponentLink4Description: Reference Circuit
footprint VSSOP8_0.65 (Footprint not found)
pins: 1 NULL (in), 2 -IN (in), 3 +IN (in), 4 -V (power), 5 NULL (in), 6 OUT (out), 7 +V (power), 8 NC

## AD8512AR
designator U?
Double Channel Low Offset Voltage Operational Amplifier, 8 MHz BW, 20 V/us SR, Industrial, 8-pin SOIC (R-8), Tube; Generic Part Number: AD8512; PartNumber: AD8512AR; Amplifiers Per Package: 2; Input Bias Current: 21pA; Input Offset Voltage: 6pA; Iq/Amp: 2.5mA; Slew Rate: 20V/us; Small Signal Bandwidth: 8MHz; V Span Max: 36V; V Span Min: 9V; DatasheetVersion: Rev. I; PackageVersion: 060506-A; PackageReference: R-8; PackageDescription: 8-Pin Standard Small Outline Package, Body 3.9 x 4.9 mm, Pitch 1.27 mm; Supplier Part Number 1: AD8512AR-ND; Mounting Technology: Surface Mount; Code_JEDEC: MS-012-AA; ComponentLink1Description: Manufacturer URL; ComponentLink2Description: Datasheet; ComponentLink3Description: Package Specification; ComponentLink4Description: Reference Circuit
footprint SOIC8_1.27 (Footprint not found)
pins on every part: 4 -V (power), 8 +V (power)
part A pins: 1 OUT A (out), 2 -IN A (in), 3 +IN A (in)
part B pins: 5 +IN B (in), 6 -IN B (in), 7 OUT B (out)

## AD8512ARMZ
designator U?
Double Channel Low Offset Voltage Operational Amplifier, 8 MHz BW, 20 V/us SR, Industrial, 8-pin SOP (RM-8), Tube; Generic Part Number: AD8512; PartNumber: AD8512ARMZ; Amplifiers Per Package: 2; Input Bias Current: 21pA; Input Offset Voltage: 6pA; Iq/Amp: 2.5mA; Slew Rate: 20V/us; Small Signal Bandwidth: 8MHz; V Span Max: 36V; V Span Min: 9V; DatasheetVersion: Rev. I; PackageReference: RM-8; PackageDescription: 8-Pin Mini Small Outline Package, Body 3 x 3 mm, Pitch 0.65 mm; Supplier Part Number 1: AD8512ARMZ-ND; Supplier Part Number 2: 2112575; Supplier Part Number 3: 19P8301; Mounting Technology: Surface Mount; Code_JEDEC: MO-187-AA; ComponentLink1Description: Manufacturer URL; ComponentLink2Description: Datasheet; ComponentLink3Description: Package Specification; ComponentLink4Description: Reference Circuit
footprint VSSOP8_0.65 (Footprint not found)
pins on every part: 4 -V (power), 8 +V (power)
part A pins: 1 OUT A (out), 2 -IN A (in), 3 +IN A (in)
part B pins: 5 +IN B (in), 6 -IN B (in), 7 OUT B (out)

## AD8512BR
designator U?
Double Channel Low Offset Voltage Operational Amplifier, 8 MHz BW, 20 V/us SR, Industrial, 8-pin SOIC (R-8), Tube; Generic Part Number: AD8512; PartNumber: AD8512BR; Amplifiers Per Package: 2; Input Bias Current: 21pA; Input Offset Voltage: 6pA; Iq/Amp: 2.5mA; Slew Rate: 20V/us; Small Signal Bandwidth: 8MHz; V Span Max: 36V; V Span Min: 9V; DatasheetVersion: Rev. I; PackageVersion: 060506-A; PackageReference: R-8; PackageDescription: 8-Pin Standard Small Outline Package, Body 3.9 x 4.9 mm, Pitch 1.27 mm; Supplier Part Number 1: AD8512BR-ND; Mounting Technology: Surface Mount; Code_JEDEC: MS-012-AA; ComponentLink1Description: Manufacturer URL; ComponentLink2Description: Datasheet; ComponentLink3Description: Package Specification; ComponentLink4Description: Reference Circuit
footprint SOIC8_1.27 (Footprint not found)
pins on every part: 4 -V (power), 8 +V (power)
part A pins: 1 OUT A (out), 2 -IN A (in), 3 +IN A (in)
part B pins: 5 +IN B (in), 6 -IN B (in), 7 OUT B (out)

## AD8513AR
designator U?
Quad Channel Low Offset Voltage Operational Amplifier, 8 MHz BW, 20 V/us SR, Industrial, 14-pin SOIC (R-14), Tube; Generic Part Number: AD8513; PartNumber: AD8513AR; Amplifiers Per Package: 4; Input Bias Current: 25pA; Input Offset Voltage: 80uV; Iq/Amp: 2.5mA; Slew Rate: 20V/us; Small Signal Bandwidth: 8MHz; V Span Max: 36V; V Span Min: 9V; DatasheetVersion: Rev. I; PackageVersion: 060606-A; PackageReference: R-14; PackageDescription: 14-Pin Standard Small Outline Package, Body 8.65 x 3.9 mm, Pitch 1.27 mm; Supplier Part Number 1: AD8513AR-ND; Mounting Technology: Surface Mount; Code_JEDEC: MS-012-AB; ComponentLink1Description: Manufacturer URL; ComponentLink2Description: Datasheet; ComponentLink3Description: Package Specification
footprint SOIC14_1.27 (Footprint not found)
pins on every part: 4 +V (power), 11 -V (power)
part A pins: 1 OUT A (out), 2 -IN A (in), 3 +IN A (in)
part B pins: 5 +IN B (in), 6 -IN B (in), 7 OUT B (out)
part C pins: 8 OUT C (out), 9 -IN C (in), 10 +IN C (in)
part D pins: 12 +IN D (in), 13 -IN D (in), 14 OUT D (out)

## AD8515AKSZ-R2
designator U?
Single Channel RRIO Operational Amplifier, 5 MHz BW, 2.7 V/us SR, Industrial, 5-pin SOT23 (KS-5), Reel; Generic Part Number: AD8515; PartNumber: AD8515AKSZ-R2; Amplifiers Per Package: 1; Input Bias Current: 2pA; Input Offset Voltage: 1mV; Iq/Amp: 500uA; Small Signal Bandwidth: 5MHz; V Span Max: 6V; V Span Min: 1.8V; DatasheetVersion: Rev. D; PackageVersion: 072809-A; PackageReference: KS-5; PackageDescription: 5-Pin Thin Shrink Small Outline Transistor Package, Body 2 x 1.25 mm, Pitch 0.65 mm; Supplier Part Number 1: AD8515AKSZ-R2TR-ND; Supplier Part Number 2: AD8515AKSZ-R2CT-ND; Supplier Part Number 3: AD8515AKSZ-R2DKR-ND; Supplier Part Number 4: 2074883; Supplier Part Number 5: 59K6787; Slew Rate: 2.7V/us; Mounting Technology: Surface Mount; Code_JEDEC: MO-203-AA; ComponentLink1Description: Manufacturer URL; ComponentLink2Description: Datasheet; ComponentLink3Description: Package Specification; ComponentLink4Description: Reference Circuit
footprint SOT353 (Footprint not found)
pins: 1 OUT (out), 2 -V (power), 3 +IN (in), 4 -IN (in), 5 +V (power)

## AD8515ARTZ-R2
designator U?
Single Channel RRIO Operational Amplifier, 5 MHz BW, 2.7 V/us SR, Industrial, 5-pin SOT23 (RJ-5), Reel; Generic Part Number: AD8515; PartNumber: AD8515ARTZ-R2; Amplifiers Per Package: 1; Input Bias Current: 2pA; Input Offset Voltage: 1mV; Iq/Amp: 500uA; Small Signal Bandwidth: 5MHz; V Span Max: 6V; V Span Min: 1.8V; DatasheetVersion: Rev. D; PackageVersion: 121608-A; PackageReference: RJ-5; PackageDescription: 5-Pin Small Outline Transistor Package, Body 2.9 x 1.6 mm, Pitch 0.95 mm; Supplier Part Number 1: AD8515ARTZ-R2TR-ND; Supplier Part Number 2: AD8515ARTZ-R2CT-ND; Supplier Part Number 3: AD8515ARTZ-R2DKR-ND; Supplier Part Number 4: 1319454; Supplier Part Number 5: 19M8910; Slew Rate: 2.7V/us; Mounting Technology: Surface Mount; Code_JEDEC: MO-178-AA; ComponentLink1Description: Manufacturer URL; ComponentLink2Description: Datasheet; ComponentLink3Description: Package Specification; ComponentLink4Description: Reference Circuit
footprint SOT23-5 (Footprint not found)
pins: 1 OUT (out), 2 -V (power), 3 +IN (in), 4 -IN (in), 5 +V (power)

## AD8522AN
designator U?
Dual 12-Bit Digital-to-Analog Converter with Serial Interface, 5 V, -40 to +85 degC, N-14, Tube; Generic Part Number: AD8522; PartNumber: AD8522AN; # DAC Outputs: 2; Max V+: 5.5V; Op Pwr Diss: 25mW; Resolution (Bits): 12; Settling Time: 16祍; Single Supply: Yes; DatasheetVersion: Rev.A; PackageVersion: 070606-A; PackageReference: N-14; PackageDescription: 14-Lead Plastic Dual In-Line Package [PDIP] Narrow Body; Supplier Part Number 1: AD8522AN-ND; Supplier Part Number 2: 66F5918; Supplier Part Number 3: 584-AD8522AN; Packing: Tube; RoHS: N; Mounting Technology: Through Hole; Code_JEDEC: MS-001; ComponentLink1Description: Manufacturer URL; ComponentLink2Description: Datasheet; ComponentLink3Description: Package Specification; ComponentLink4Description: Product URL
footprint DIP14 (Footprint not found)
pins: 1 VOUTA (out) "DAC A voltage outputs, 4.095 V full scale, +/-5 mA output.", 2 AGND (power) "Analog Ground Input.", 3 DGND (power) "Digital Ground Input.", 4 ~{CS} (in) "Chip Select, active low input. Prevents shift register loading when high. Does not affect L\D\A\ and L\D\B\ operation.", 5 CLK (in) "Clock input, positive edge clocks data into shift register.", 6 SDI (in) "Serial Data Input, input data loads directly into the shift register.", 7 SDO (out) "Serial Data Output. Output of shift register, always active.", 8 ~{LDB} (in) "Load DAC register strobes, active low. Transfers shift register data to DAC register. See truth table for operation.Software decode feature only requires one L\D\ strobe. Tie L\D\A\ and L\D\B\ together or use one of them (See Datasheet)", 9 ~{LDA} (in) "Load DAC register strobes, active low. Transfers shift register data to DAC register. See truth table for operation.Software decode feature only requires one L\D\ strobe. Tie L\D\A\ and L\D\B\ together or use one of them (See Datasheet)", 10 ~{RS} (in) "Resets DAC registers to condition determined by MSB pin. Active low input.", 11 MSB (in) "Digital input: High presets DAC registers to half scale (800H); Low clears all registers to zero (000H), when R\S\ is strobed to active low.", 12 VDD (power) "Positive +5 V power supply input. Tolerance +/-10%.", 13 VREF (out) "Reference Voltage Output, 2.5 V nominal.", 14 VOUTB (out) "DAC B voltage outputs, 4.095 V full scale, +/-5 mA output."

## AD8522AR
designator U?
Dual 12-Bit Digital-to-Analog Converter with Serial Interface, 5 V, -40 to +85 degC, R-14, Tube; Generic Part Number: AD8522; PartNumber: AD8522AR; # DAC Outputs: 2; Max V+: 5.5V; Op Pwr Diss: 25mW; Resolution (Bits): 12; Settling Time: 16祍; Single Supply: Yes; DatasheetVersion: Rev.A; PackageVersion: 060606-A; PackageReference: R-14; PackageDescription: 14-Lead Standard Small Outline Package [SOIC_N]; Supplier Part Number 1: AD8522AR-ND; Supplier Part Number 2: 584-AD8522AR; Packing: Tube; RoHS: N; Mounting Technology: Surface Mount; Code_JEDEC: MS-012-AB; Code_IPC: SOIC127P600-14; ComponentLink1Description: Manufacturer URL; ComponentLink2Description: Datasheet; ComponentLink3Description: Package Specification; ComponentLink4Description: Product URL
footprint SOIC14_1.27 (Footprint not found)
pins: 1 VOUTA (out) "DAC A voltage outputs, 4.095 V full scale, +/-5 mA output.", 2 AGND (power) "Analog Ground Input.", 3 DGND (power) "Digital Ground Input.", 4 ~{CS} (in) "Chip Select, active low input. Prevents shift register loading when high. Does not affect L\D\A\ and L\D\B\ operation.", 5 CLK (in) "Clock input, positive edge clocks data into shift register.", 6 SDI (in) "Serial Data Input, input data loads directly into the shift register.", 7 SDO (out) "Serial Data Output. Output of shift register, always active.", 8 ~{LDB} (in) "Load DAC register strobes, active low. Transfers shift register data to DAC register. See truth table for operation.Software decode feature only requires one L\D\ strobe. Tie L\D\A\ and L\D\B\ together or use one of them (See Datasheet)", 9 ~{LDA} (in) "Load DAC register strobes, active low. Transfers shift register data to DAC register. See truth table for operation.Software decode feature only requires one L\D\ strobe. Tie L\D\A\ and L\D\B\ together or use one of them (See Datasheet)", 10 ~{RS} (in) "Resets DAC registers to condition determined by MSB pin. Active low input.", 11 MSB (in) "Digital input: High presets DAC registers to half scale (800H); Low clears all registers to zero (000H), when R\S\ is strobed to active low.", 12 VDD (power) "Positive +5 V power supply input. Tolerance +/-10%.", 13 VREF (out) "Reference Voltage Output, 2.5 V nominal.", 14 VOUTB (out) "DAC B voltage outputs, 4.095 V full scale, +/-5 mA output."